# Altium footprint library PCB_General.PcbLib: 68 footprints (part 4 of 5)
Each footprint in its own frame and in the unit in brackets; x right, y up, seen from the top. Pads: shape width x height; smd on the part's side, far side on the other; paste and mask are expansions set on the pad; w line width, h text height; cw(c..) or ccw(c..) is an arc to the next point about the centre after c.
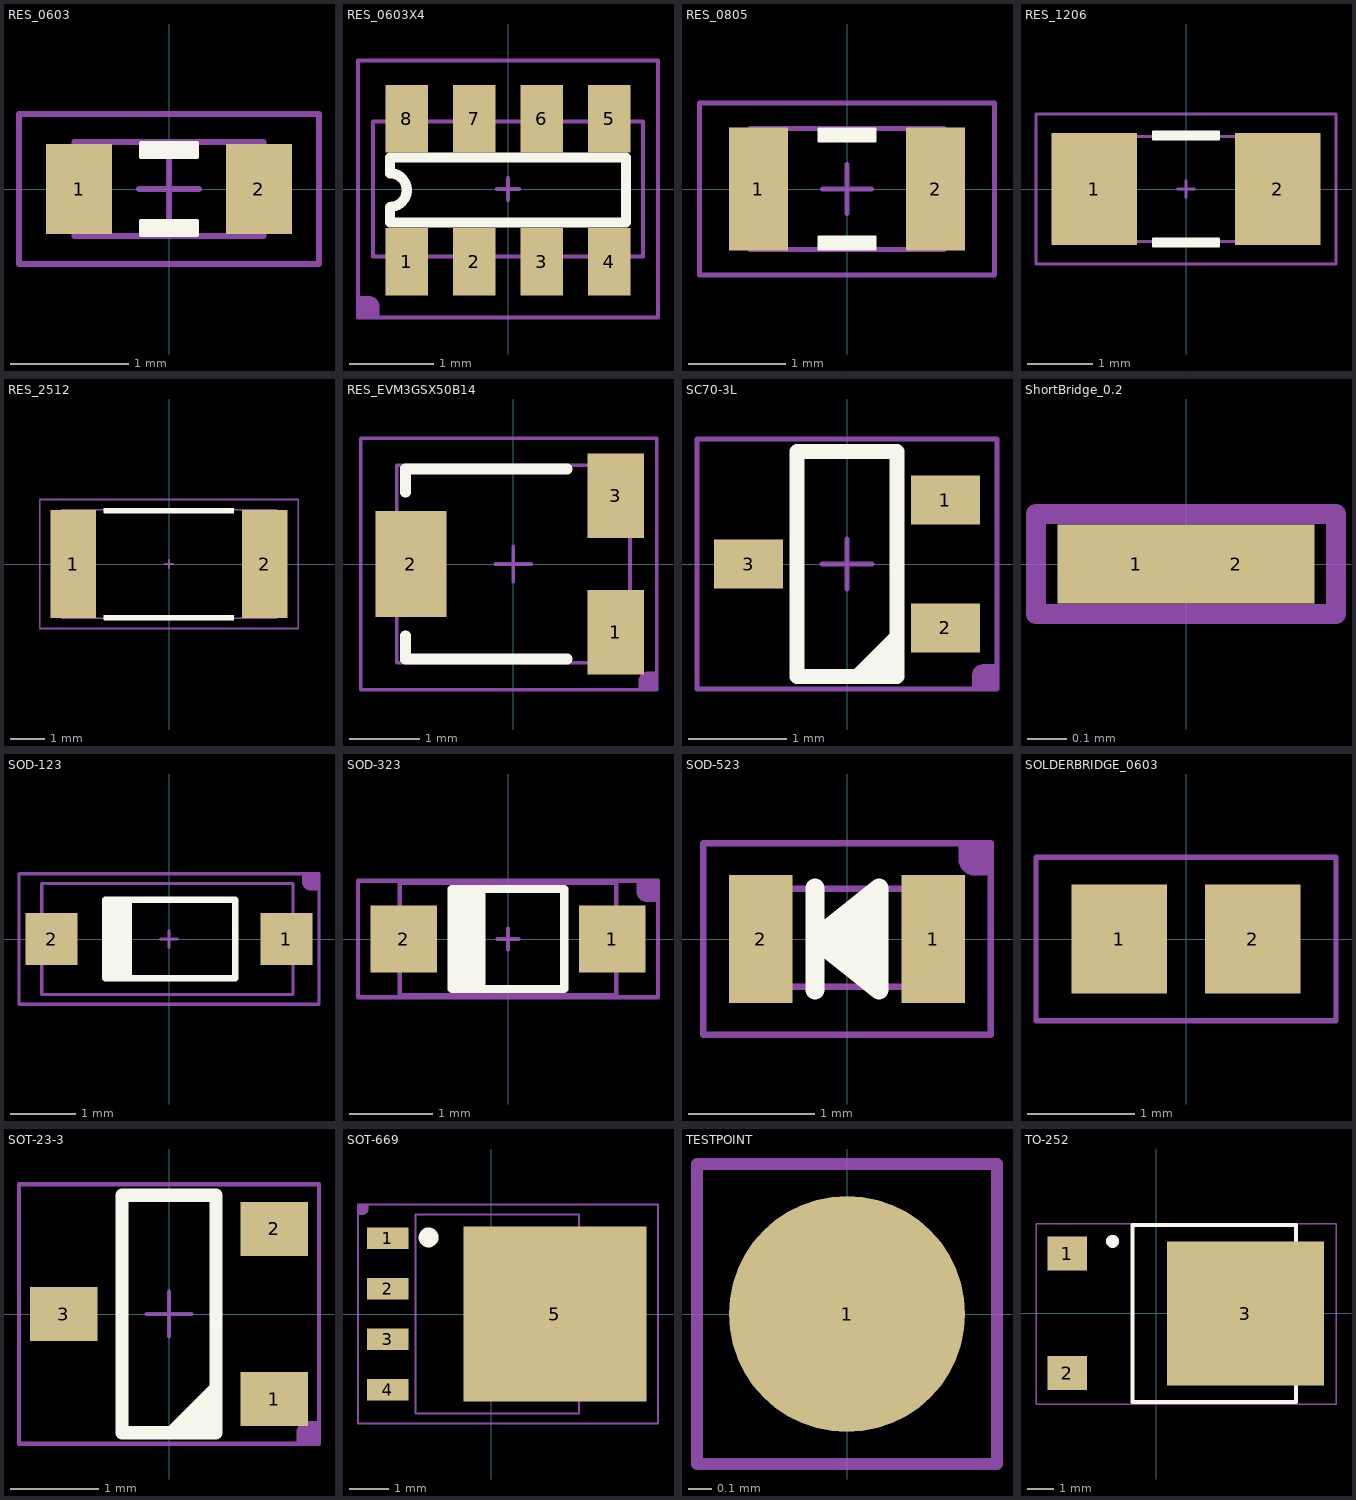
[diagram p3: the footprints below, top view; thin cyan lines are the x and y axes]

## RES_0603 [mil]
height 17.72
pads (2):
  rect 22x30 smd: 1(-30,0) 2(30,0)
Top Overlay:
  region: -9.5,15.5 9.5,15.5 9.5,10.5 -9.5,10.5
  region: 9.5,-15.5 -9.5,-15.5 -9.5,-10.5 9.5,-10.5
  lines w1: -9.5,-15.5 9.5,-15.5 9.5,-10.5 -9.5,-10.5 -9.5,-15.5 ; -9.5,10.5 -9.5,15.5 9.5,15.5 9.5,10.5 -9.5,10.5
Top Assembly (Mech13):
  lines w2: -10,0 10,0 ; 0,-10 0,10 ; -31.5,-15.75 -31.5,15.75 31.5,15.75 31.5,-15.75 -31.5,-15.75
Top Component:
  lines w2: -50,-25 50,-25 50,25 -50,25 -50,-25
  text ".Designator" at -45,-15 h60
3D body "RESC1608X05L.step": height 17.72, standoff 0, extent -31.49,-15.74 31.5,15.75

## RES_0603X4 [mm]
pads (8):
  rect 0.5x0.8 smd: 1(-1.2,-0.865) 2(-0.4,-0.865) 3(0.4,-0.865) 4(1.2,-0.865) 5(1.2,0.835) 6(0.4,0.835) 7(-0.4,0.835) 8(-1.2,0.835)
Top Overlay:
  lines w0.12: -1.4,-0.398 -1.4,-0.213 ccw(c-1.4,-0.013) -1.4,0.187 -1.4,0.372 1.4,0.372 1.4,-0.398 -1.4,-0.398
Top Assembly (Mech13):
  lines w0.051: -0.127,0 0.127,0 ; 0,-0.127 0,0.127 ; -1.6,-0.8 -1.6,0.8 1.6,0.8 1.6,-0.8 -1.6,-0.8
Top Component:
  region: -1.778,-1.524 -1.778,-1.27 -1.651,-1.27 -1.626,-1.27 -1.579,-1.289 -1.543,-1.325 -1.524,-1.372 -1.524,-1.397 -1.524,-1.524
  lines w0.051: -1.778,-1.524 -1.778,1.524 1.778,1.524 1.778,-1.524 -1.778,-1.524
  text ".Designator" at -1.016,-0.381 h1.52
3D body "User Library-R-0603-Array-4-1.SLDPRT": height 0.51, standoff -0.01, extent -1.6,-0.8 1.6,0.8

## RES_0805 [mil]
height 23.62
pads (2):
  rect 24x50 smd: 1(-36,0) 2(36,0)
Top Overlay:
  region: -11.5,24.5 11.5,24.5 11.5,19.5 -11.5,19.5
  region: 11.5,-24.5 -11.5,-24.5 -11.5,-19.5 11.5,-19.5
  lines w1: -11.5,-24.5 -11.5,-19.5 11.5,-19.5 11.5,-24.5 -11.5,-24.5 ; -11.5,19.5 11.5,19.5 11.5,24.5 -11.5,24.5 -11.5,19.5
Top Assembly (Mech13):
  lines w2: -10,0 10,0 ; 0,-10 0,10 ; -39.37,-24.61 -39.37,24.61 39.37,24.61 39.37,-24.61 -39.37,-24.61
Top Component:
  lines w2: -60,-35 60,-35 60,35 -60,35 -60,-35
  text ".Designator" at -50,-20 h80
3D body "RESC2012X06L.step": height 23.62, standoff 0, extent -39.37,-24.6 39.37,24.61

## RES_1206 [mm]
height 1.23
pads (2):
  rect 1.3x1.7 smd: 1(-1.4,0) 2(1.4,0)
Top Overlay:
  region: -0.508,0.876 0.508,0.876 0.508,0.749 -0.508,0.749
  region: 0.508,-0.876 -0.508,-0.876 -0.508,-0.749 0.508,-0.749
  lines w0.025: -0.508,-0.876 -0.508,-0.749 0.508,-0.749 0.508,-0.876 -0.508,-0.876 ; -0.508,0.749 0.508,0.749 0.508,0.876 -0.508,0.876 -0.508,0.749
Top Assembly (Mech13):
  lines w0.051: -0.127,0 0.127,0 ; 0,-0.127 0,0.127 ; -1.6,-0.8 1.6,-0.8 1.6,0.8 -1.6,0.8 -1.6,-0.8
Top Component:
  lines w0.051: -2.286,-1.143 2.286,-1.143 2.286,1.143 -2.286,1.143 -2.286,-1.143
  text ".Designator" at -2.032,-0.508 h2.03
3D body "R_1206.STEP": height 1.01, standoff -0.01, extent -1.6,-0.8 1.6,0.8

## RES_2512 [mm]
pads (2):
  rect 1.35x3.2 smd: 1(-2.825,0) 2(2.825,0)
Top Overlay:
  region: 1.905,-1.638 -1.905,-1.638 -1.905,-1.511 1.905,-1.511
  region: -1.905,1.638 1.905,1.638 1.905,1.511 -1.905,1.511
  lines w0.025: -1.905,-1.638 1.905,-1.638 1.905,-1.511 -1.905,-1.511 -1.905,-1.638 ; -1.905,1.511 -1.905,1.638 1.905,1.638 1.905,1.511 -1.905,1.511
Top Assembly (Mech13):
  lines w0.051: -0.127,0 0.127,0 ; 0,-0.127 0,0.127 ; -3.175,-1.6 -3.175,1.6 3.175,1.6 3.175,-1.6 -3.175,-1.6
Top Component:
  lines w0.051: -3.81,-1.905 -3.81,1.905 3.81,1.905 3.81,-1.905 -3.81,-1.905
  text ".Designator" at -1.524,-0.508 h2.03
3D body "R_2512.STEP": height 0.66, standoff -0.01, extent -3.175,-1.6 3.175,1.6

## RES_EVM3GSX50B14 [mm]
height 1.003
pads (3):
  rect 0.8x1.2 smd: 1(1.448,-0.965) 3(1.448,0.965)
  rect 1x1.5 smd: 2(-1.448,0)
Top Overlay:
  lines w0.152: -1.524,-1.016 -1.524,-1.346 0.762,-1.346 ; -1.524,1.016 -1.524,1.346 0.762,1.346
Top Assembly (Mech13):
  lines w0.051: -0.254,0 0.254,0 ; 0,-0.254 0,0.254 ; -1.651,-1.4 -1.651,1.4 1.651,1.4 1.651,-1.4 -1.651,-1.4
Top Component:
  region: 2.032,-1.778 1.778,-1.778 1.778,-1.651 1.778,-1.626 1.797,-1.579 1.833,-1.543 1.88,-1.524 1.905,-1.524 2.032,-1.524
  lines w0.051: -2.159,-1.778 -2.159,1.778 2.032,1.778 2.032,-1.778 -2.159,-1.778
  text ".Designator" at -1.295,-0.635 h2.03

## SC70-3L [mm]
pads (3):
  rect 0.7x0.5 smd: 1(1,0.65) 2(1,-0.65) 3(-1,0)
Top Overlay:
  region: 0.508,-1.143 0,-1.143 0.508,-0.635
  lines w0.152: -0.508,-1.143 -0.508,1.143 0.508,1.143 0.508,-1.143 -0.508,-1.143
Top Assembly (Mech13):
  lines w0.051: -0.254,0 0.254,0 ; 0,-0.254 0,0.254
Top Component:
  region: 1.524,-1.27 1.27,-1.27 1.27,-1.143 1.27,-1.118 1.289,-1.071 1.325,-1.035 1.372,-1.016 1.397,-1.016 1.524,-1.016
  lines w0.051: -1.524,-1.27 -1.524,1.27 1.524,1.27 1.524,-1.27 -1.524,-1.27
  text ".Designator" at -0.762,-0.508 h2.03
3D body "User Library-SOT323 (SC70-3)-1.STEP": height 1.1, standoff 0, extent -1.123,-1.1 1.123,1.1

## ShortBridge_0.2 [mm]
pads (2):
  rect 0.4x0.2 smd: 1(-0.127,0) 2(0.127,0)
Top Component:
  lines w0.051: -0.381,-0.127 0.381,-0.127 0.381,0.127 -0.381,0.127 -0.381,-0.127

## SOD-123 [mm]
pads (2):
  rect 0.8x0.8 smd: 1(1.8,0) 2(-1.8,0)
Top Overlay:
  region: -1.025,-0.6 -1.025,0.6 -0.575,0.6 -0.575,-0.6
  lines w0.1: -0.975,-0.6 1.016,-0.6 1.016,0.6 -0.975,0.6
Top Assembly (Mech13):
  lines w0.051: -0.127,0 0.127,0 ; 0,-0.127 0,0.127 ; -1.95,-0.85 -1.95,0.85 1.9,0.85 1.9,-0.85 -1.95,-0.85
Top Component:
  region: 2.3,1 2.3,0.746 2.173,0.746 2.148,0.746 2.101,0.765 2.065,0.801 2.046,0.848 2.046,0.873 2.046,1
  lines w0.051: -2.3,-1 2.3,-1 2.3,1 -2.3,1 -2.3,-1
  text ".Designator" at -1.422,-0.508 h2.03
3D body "User Library-SOD-123_DiodesInc.STEP": height 1.42, standoff -0.03, extent -1.95,-0.85 1.9,0.85

## SOD-323 [mm]
pads (2):
  rect 0.8x0.8 smd: 1(1.25,0) 2(-1.25,0)
Top Overlay:
  region: -0.725,-0.6 -0.725,0.6 -0.275,0.6 -0.275,-0.6
  lines w0.1: -0.675,-0.6 0.675,-0.6 0.675,0.6 -0.675,0.6
Top Assembly (Mech13):
  lines w0.051: -0.127,0 0.127,0 ; 0,-0.127 0,0.127 ; -1.3,-0.675 -1.3,0.675 1.3,0.675 1.3,-0.675 -1.3,-0.675
Top Component:
  region: 1.8,0.7 1.8,0.446 1.673,0.446 1.648,0.446 1.601,0.465 1.565,0.501 1.546,0.548 1.546,0.573 1.546,0.7
  lines w0.051: -1.8,-0.7 -1.8,0.7 1.8,0.7 1.8,-0.7 -1.8,-0.7
  text ".Designator" at -1.168,-0.508 h2.03
3D body "User Library-SOD323-1.STEP": height 1.1, standoff 0, extent -1.3,-0.675 1.3,0.675

## SOD-523 [mil]
height 45.28
pads (2):
  rect 20x40 smd: 1(27,0) 2(-27,0)
Top Overlay:
  region: 10,-16 10,16 -10,0
  lines w6: -10,-16 -10,16 ; -10,0 10,-16 10,16 -10,0
Top Assembly (Mech13):
  lines w2: -10,0 10,0 ; -5,0 5,0 ; 0,-10 0,10 ; 0,-5 0,5 ; -31.5,-15 31.5,-15 31.5,15.7 -31.5,15.7 -31.5,-15
Top Component:
  region: 45,30 45,20 40,20 39.01,20 37.17,20.76 35.76,22.17 35,24.01 35,25 35,30
  lines w2: -45,-30 -45,30 45,30 45,-30 -45,-30
  text ".Designator" at -35,-15 h60
3D body "User Library-SOD-523F.STEP": height 27.56, standoff 0, extent -31.5,-15.7 31.5,15.7

## SOLDERBRIDGE_0603 [mil]
pads (2):
  rect 35x40 smd: 1(-24.5,0) 2(24.5,0)
Top Component:
  lines w2: -55,-30 55,-30 55,30 -55,30 -55,-30
  text ".Designator" at -35,-15 h60

## SOT-23-3 [mil]
height 39.5
pads (3):
  rect 30x24 smd: 1(47,-38) 2(47,38) 3(-47,0)
Top Overlay:
  region: 21,-53 -3,-53 21,-29
  lines w6: -21,-53 -21,53 21,53 21,-53 -21,-53
Top Assembly (Mech13):
  lines w2: -10,0 10,0 ; 0,-10 0,10
Top Component:
  region: 67,-58 57,-58 57,-53 57,-52.01 57.76,-50.17 59.17,-48.76 61.01,-48 62,-48 67,-48
  lines w2: -67,-58 67,-58 67,58 -67,58 -67,-58
  text ".Designator" at -41,-20 h80
3D body "User Library-SOT23-3.STEP": height 51.18, standoff 0, extent -55.12,-57.09 55.11,57.09

## SOT-669 [mm] "DPAK, 4-Leads, Body 5x4.1mm, Pitch 1.27mm, IPC Medium Density"
height 1.2
pads (5):
  rect 1.05x0.55 smd: 1(-2.6,1.905) 2(-2.6,0.635) 3(-2.6,-0.635) 4(-2.6,-1.905)
  rect 4.6x4.4 smd: 5(1.6,0)
Top Overlay:
  circle w0.25: c-1.575,1.925 r0.125
Top Assembly (Mech13):
  lines w0.051: -1.9,-2.5 2.2,-2.5 2.2,2.5 -1.9,2.5 -1.9,-2.5
Top Component:
  region: -3.35,2.75 -3.096,2.75 -3.096,2.623 -3.096,2.598 -3.115,2.551 -3.151,2.515 -3.198,2.496 -3.223,2.496 -3.35,2.496
  lines w0.05: -3.35,-2.75 -3.35,2.75 4.191,2.75 4.191,-2.75 -3.35,-2.75
  text ".Designator" at -0.787,-0.508 h2.03
3D body "SOT669-CW.step": height 1.15, standoff -0.05, extent -2.878,-2.45 3.55,2.45

## TESTPOINT [mm]
pads (1):
  round 1 smd paste-1: 1(0,0)
Top Component:
  lines w0.051: -0.635,-0.635 -0.635,0.635 0.635,0.635 0.635,-0.635 -0.635,-0.635
  text ".Designator" at -0.508,-0.254 h0.76

## TO-252 [mm]
pads (3):
  rect 1.5x1.3 smd: 1(-3.4,2.28) 2(-3.4,-2.28)
  rect 6x5.5 smd: 3(3.4,-0.01)
Top Overlay:
  circle w0.25: c-1.67,2.75 r0.125
  lines w0.154: -0.911,-3.384 5.338,-3.384 5.338,3.372 -0.911,3.372 -0.911,-3.384
Top Component:
  lines w0.051: -4.595,-3.475 6.862,-3.475 6.862,3.425 -4.595,3.425 -4.595,-3.475
  text ".Designator" at -1.114,-0.641 h2.03
3D body "User Library-DPAK_TO-252AA.SLDPRT": height 2.37, standoff -0.03, extent -3.961,-3.373 6.139,3.361